# Altium footprint library ACTION_IC封装.PcbLib: 114 footprints (part 2 of 8)
Each footprint in its own frame and in the unit in brackets; x right, y up, seen from the top. Pads: shape width x height; smd on the part's side, far side on the other; paste and mask are expansions set on the pad; w line width, h text height; cw(c..) or ccw(c..) is an arc to the next point about the centre after c.
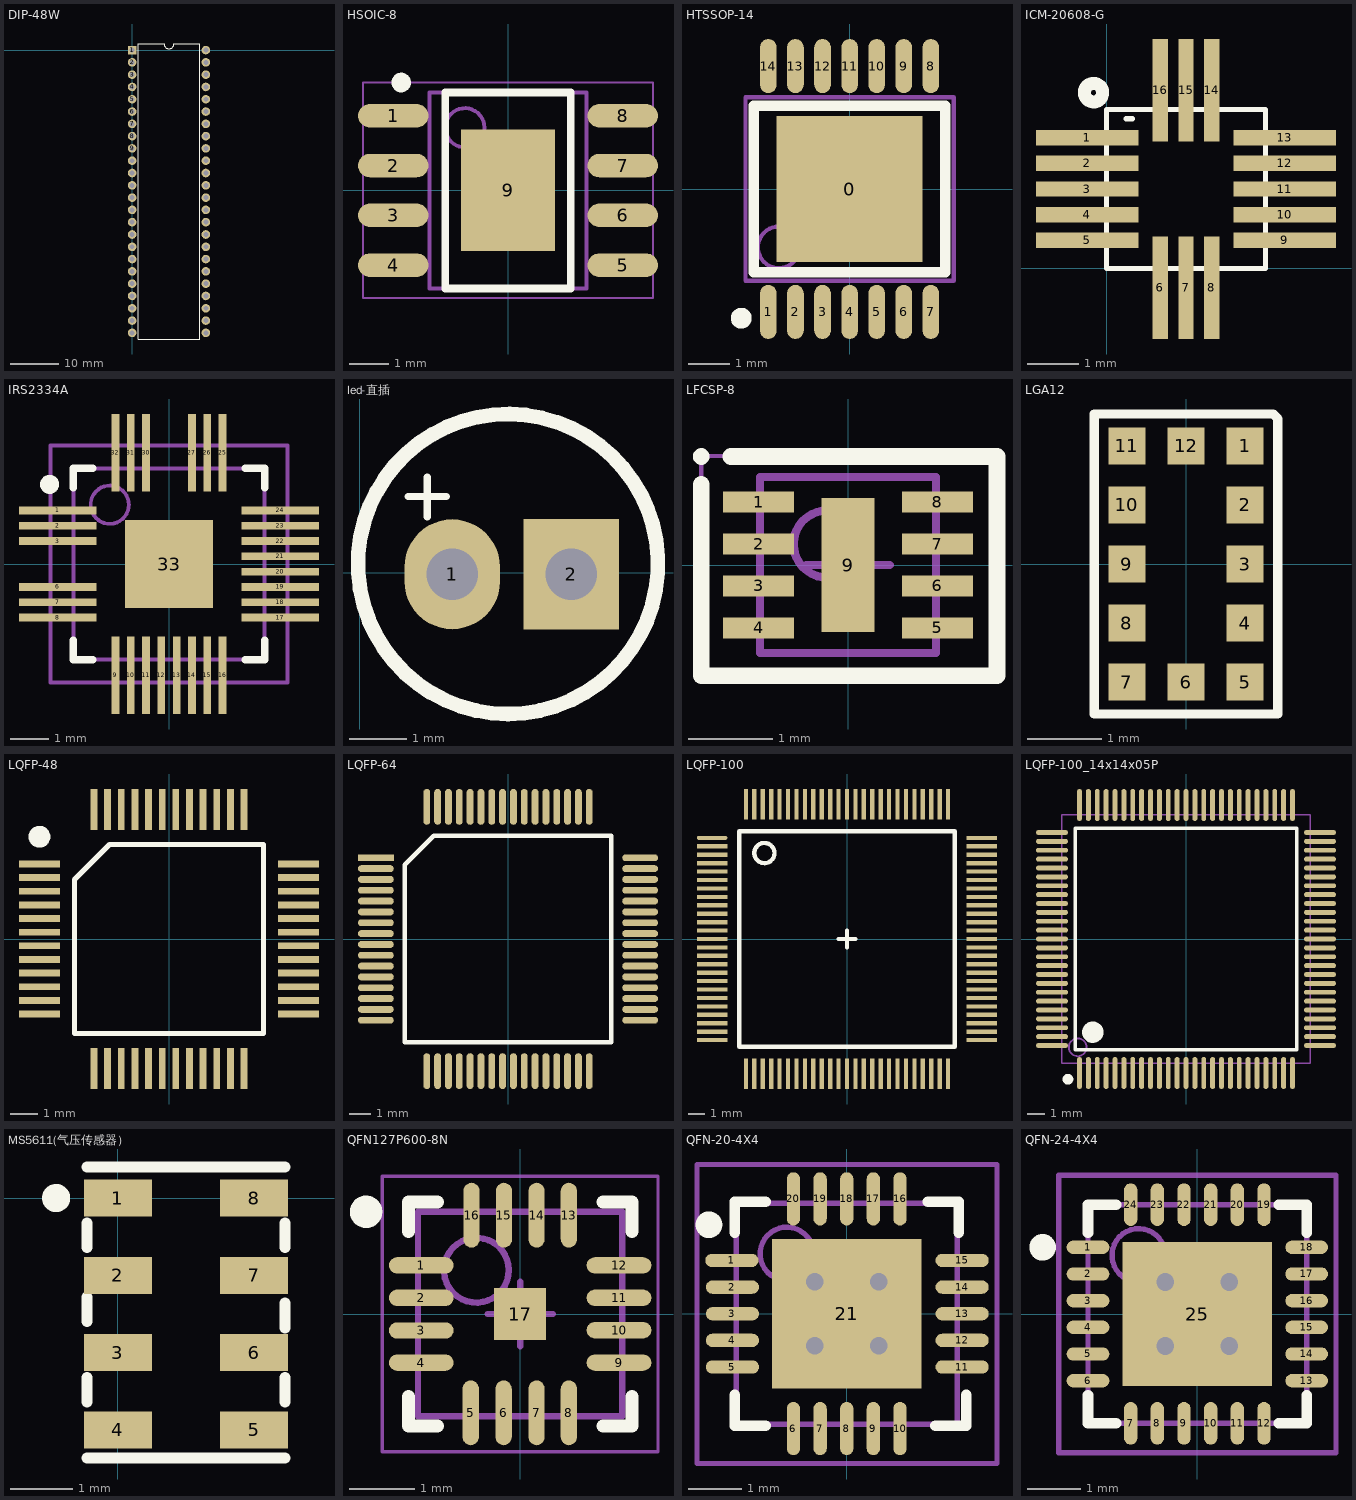
[diagram p1: the footprints below, top view; thin cyan lines are the x and y axes]

## DIP-48W [mil]
pads (48):
  rect 70x70 hole 40: 1(0,0)
  round 70 hole 40: 2(0,-100) 3(0,-200) 4(0,-300) 5(0,-400) 6(0,-500) 7(0,-600) 8(0,-700) 9(0,-800) 10(0,-900) 11(0,-1000) 12(0,-1100) 13(0,-1200) 14(0,-1300) 15(0,-1400) 16(0,-1500) 17(0,-1600) 18(0,-1700) 19(0,-1800) 20(0,-1900) 21(0,-2000) 22(0,-2100) 23(0,-2200) 24(0,-2300) 25(600,-2300) 26(600,-2200) 27(600,-2100) 28(600,-2000) 29(600,-1900) 30(600,-1800) 31(600,-1700) 32(600,-1600) 33(600,-1500) 34(600,-1400) 35(600,-1300) 36(600,-1200) 37(600,-1100) 38(600,-1000) 39(600,-900) 40(600,-800) 41(600,-700) 42(600,-600) 43(600,-500) 44(600,-400) 45(600,-300) 46(600,-200) 47(600,-100) 48(600,0)
Top Overlay:
  lines w10: 50,-2350 550,-2350 550,50 340,50 cw(c300,50) 260,50 50,50 50,-2350
3D body "DIP48.STEP": height 183.46, standoff -129.13, extent 1.52,-2365.87 616.48,55

## HSOIC-8 [mm]
height 1.7
pads (9):
  oval 1.8x0.6 smd: 1(-2.928,1.905) 2(-2.928,0.635) 3(-2.928,-0.635) 4(-2.928,-1.905) 5(2.928,-1.905) 6(2.928,-0.635) 7(2.928,0.635) 8(2.928,1.905)
  rect 2.4x3.1 smd: 9(0,0)
Top Overlay:
  circle w0.25: c-2.725,2.755 r0.125
  lines w0.2: -1.6,-2.5 1.6,-2.5 1.6,2.5 -1.6,2.5 -1.6,-2.5
Mechanical 13:
  circle w0.1: c-1.1,1.6 r0.5
  lines w0.1: -2,-2.5 2,-2.5 2,2.5 -2,2.5 -2,-2.5
Mechanical 15:
  lines w0.05: -3.7,-2.75 3.7,-2.75 3.7,2.75 -3.7,2.75 -3.7,-2.75
  lines w0.1: -0.5,0 0.5,0 ; 0,-0.5 0,0.5
3D body "User Library-sop-8.STEP": height 1.6, standoff 0, extent -3.021,-2.51 3.021,2.51

## HTSSOP-14 [mm]
pads (15):
  rect 3.5x3.5 smd mask+0.051: 0(0,0)
  oval 0.4x1.3 smd mask+0.051: 1(-1.95,-2.95) 2(-1.3,-2.95) 3(-0.65,-2.95) 4(0,-2.95) 5(0.65,-2.95) 6(1.3,-2.95) 7(1.95,-2.95) 8(1.95,2.95) 9(1.3,2.95) 10(0.65,2.95) 11(0,2.95) 12(-0.65,2.95) 13(-1.3,2.95) 14(-1.95,2.95)
Top Overlay:
  circle w0.25: c-2.6,-3.1 r0.125
  lines w0.254: -2.3,-2 -2.3,2 2.3,2 2.3,-2 -2.3,-2
Mechanical 13:
  circle w0.1: c-1.7,-1.4 r0.5
  lines w0.1: -2.5,-2.2 -2.5,2.2 2.5,2.2 2.5,-2.2 -2.5,-2.2

## ICM-20608-G [mm] "ICM-20608-G"
height 0.86
pads (16):
  rect 2x0.3 smd: 1(-0.375,2.55) 2(-0.375,2.05) 3(-0.375,1.55) 4(-0.375,1.05) 5(-0.375,0.55) 9(3.475,0.55) 10(3.475,1.05) 11(3.475,1.55) 12(3.475,2.05) 13(3.475,2.55)
  rect 0.3x2 smd: 6(1.05,-0.375) 7(1.55,-0.375) 8(2.05,-0.375) 14(2.05,3.475) 15(1.55,3.475) 16(1.05,3.475)
Top Overlay:
  lines w0.1: 0.381,2.921 0.508,2.921 ; 0,0 0,3.1 3.1,3.1 3.1,0 0,0
  lines w0.254: -0.254,3.609 ccw(c-0.254,3.429) -0.21,3.603

## IRS2334A [mm] "irs2334"
height 1
pads (29):
  rect 2.032x0.2 smd: 1(-2.906,1.4) 2(-2.906,1) 3(-2.906,0.6) 6(-2.906,-0.6) 7(-2.906,-1) 8(-2.906,-1.4) 17(2.906,-1.4) 18(2.906,-1) 19(2.906,-0.6) 20(2.906,-0.2) 21(2.906,0.2) 22(2.906,0.6) 23(2.906,1) 24(2.906,1.4)
  rect 0.2x2.032 smd: 9(-1.4,-2.906) 10(-1,-2.906) 11(-0.6,-2.906) 12(-0.2,-2.906) 13(0.2,-2.906) 14(0.6,-2.906) 15(1,-2.906) 16(1.4,-2.906) 25(1.4,2.906) 26(1,2.906) 27(0.6,2.906) 30(-0.6,2.906) 31(-1,2.906) 32(-1.4,2.906)
  rect 2.3x2.3 smd: 33(0,0)
Top Overlay:
  circle w0.25: c-3.122,2.083 r0.125
  lines w0.2: -2.5,-2 -2.5,-2.5 -2,-2.5 ; -2.5,2 -2.5,2.5 -2,2.5 ; 2,-2.5 2.5,-2.5 2.5,-2 ; 2,2.5 2.5,2.5 2.5,2
Mechanical 13:
  circle w0.1: c-1.55,1.55 r0.5
  lines w0.1: -2.5,-2.5 2.5,-2.5 2.5,2.5 -2.5,2.5 -2.5,-2.5
Mechanical 15:
  lines w0.1: -0.5,0 0.5,0 ; 0,-0.5 0,0.5 ; -3.1,-3.1 3.1,-3.1 3.1,3.1 -3.1,3.1 -3.1,-3.1
3D body: height 1, standoff 0.02, extent -2.5,-2.5 2.5,2.5

## led-直插 [mil]
pads (2):
  oval 65x75 hole 35.13: 1(63,-1)
  rect 65x75 hole 35.13: 2(144,-1)
Top Overlay:
  lines w5: 33,52 59,52 ; 46,38 46,65
  lines w10: -1.1,2.17 cw(c101,6) -1,0
3D body "LED-R.STEP": height 326.77, standoff -118.11, extent 11.45,-100 192.55,100.79

## LFCSP-8 [mm]
height 0.6
pads (9):
  rect 0.85x0.25 smd: 1(-1.067,0.75) 2(-1.067,0.25) 3(-1.067,-0.25) 4(-1.067,-0.75) 5(1.067,-0.75) 6(1.067,-0.25) 7(1.067,0.25) 8(1.067,0.75)
  rect 0.63x1.6 smd: 9(0,0)
Top Overlay:
  circle w0.1: c-1.753,1.295 r0.05
  lines w0.2: -1.753,0.965 -1.753,-1.321 1.778,-1.321 1.778,1.295 -1.397,1.295
Mechanical 13:
  circle w0.1: c-0.25,0.25 r0.4
  lines w0.1: -1.05,-1.05 -1.05,1.05 1.05,1.05 1.05,-1.05 -1.05,-1.05
Mechanical 15:
  lines w0.05: -1.753,-1.3 -1.753,1.3 1.778,1.3 1.778,-1.3 -1.753,-1.3
  lines w0.1: -0.5,0 0.5,0 ; 0,-0.5 0,0.5
3D body: height 0.6, standoff 0.05, extent -1.05,-1.05 1.05,1.05

## LGA12 [mm]
pads (12):
  rect 0.5x0.5 smd: 1(0.8,1.6) 2(0.8,0.8) 3(0.8,0) 4(0.8,-0.8) 5(0.8,-1.6) 6(0,-1.6) 7(-0.8,-1.6) 8(-0.8,-0.8) 9(-0.8,0) 10(-0.8,0.8) 11(-0.8,1.6) 12(0,1.6)
Top Overlay:
  lines w0.127: -1.245,-2.032 -1.245,2.032 1.181,2.032 1.245,1.968 1.245,-2.032 -1.245,-2.032
3D body: height 1.05, standoff 0, extent -1.168,-1.956 1.143,1.956

## LQFP-48 [mm]
pads (48):
  rect 1.5x0.25 smd: 1(-4.75,2.75) 2(-4.75,2.25) 3(-4.75,1.75) 4(-4.75,1.25) 5(-4.75,0.75) 6(-4.75,0.25) 7(-4.75,-0.25) 8(-4.75,-0.75) 9(-4.75,-1.25) 10(-4.75,-1.75) 11(-4.75,-2.25) 12(-4.75,-2.75) 25(4.75,-2.75) 26(4.75,-2.25) 27(4.75,-1.75) 28(4.75,-1.25) 29(4.75,-0.75) 30(4.75,-0.25) 31(4.75,0.25) 32(4.75,0.75) 33(4.75,1.25) 34(4.75,1.75) 35(4.75,2.25) 36(4.75,2.75)
  rect 0.25x1.5 smd: 13(-2.75,-4.75) 14(-2.25,-4.75) 15(-1.75,-4.75) 16(-1.25,-4.75) 17(-0.75,-4.75) 18(-0.25,-4.75) 19(0.25,-4.75) 20(0.75,-4.75) 21(1.25,-4.75) 22(1.75,-4.75) 23(2.25,-4.75) 24(2.75,-4.75) 37(2.75,4.75) 38(2.25,4.75) 39(1.75,4.75) 40(1.25,4.75) 41(0.75,4.75) 42(0.25,4.75) 43(-0.25,4.75) 44(-0.75,4.75) 45(-1.25,4.75) 46(-1.75,4.75) 47(-2.25,4.75) 48(-2.75,4.75)
Top Overlay:
  circle w0.4: c-4.75,3.75 r0.2
  lines w0.2: -3.465,-3.465 3.465,-3.465 3.465,3.465 -2.18,3.465 -3.465,2.18 -3.465,-3.465
3D body "LQFP7X7-48.STEP": height 1.56, standoff 0, extent -4.525,-4.48 4.474,4.52

## LQFP-64 [mm]
pads (64):
  rect 1.651x0.32 smd: 1(-6.1,3.75)
  oval 1.651x0.32 smd: 2(-6.1,3.25) 3(-6.1,2.75) 4(-6.1,2.25) 5(-6.1,1.75) 6(-6.1,1.25) 7(-6.1,0.75) 8(-6.1,0.25) 9(-6.1,-0.25) 10(-6.1,-0.75) 11(-6.1,-1.25) 12(-6.1,-1.75) 13(-6.1,-2.25) 14(-6.1,-2.75) 15(-6.1,-3.25) 16(-6.1,-3.75) 33(6.1,-3.75) 34(6.1,-3.25) 35(6.1,-2.75) 36(6.1,-2.25) 37(6.1,-1.75) 38(6.1,-1.25) 39(6.1,-0.75) 40(6.1,-0.25) 41(6.1,0.25) 42(6.1,0.75) 43(6.1,1.25) 44(6.1,1.75) 45(6.1,2.25) 46(6.1,2.75) 47(6.1,3.25) 48(6.1,3.75)
  oval 0.32x1.651 smd: 17(-3.75,-6.1) 18(-3.25,-6.1) 19(-2.75,-6.1) 20(-2.25,-6.1) 21(-1.75,-6.1) 22(-1.25,-6.1) 23(-0.75,-6.1) 24(-0.25,-6.1) 25(0.25,-6.1) 26(0.75,-6.1) 27(1.25,-6.1) 28(1.75,-6.1) 29(2.25,-6.1) 30(2.75,-6.1) 31(3.25,-6.1) 32(3.75,-6.1) 49(3.75,6.1) 50(3.25,6.1) 51(2.75,6.1) 52(2.25,6.1) 53(1.75,6.1) 54(1.25,6.1) 55(0.75,6.1) 56(0.25,6.1) 57(-0.25,6.1) 58(-0.75,6.1) 59(-1.25,6.1) 60(-1.75,6.1) 61(-2.25,6.1) 62(-2.75,6.1) 63(-3.25,6.1) 64(-3.75,6.1)
Top Overlay:
  lines w0.2: -4.765,-4.765 4.765,-4.765 4.765,4.765 -3.43,4.765 -4.765,3.43 -4.765,-4.765
3D body "LQFP-64.STEP": height 1.6, standoff 0, extent -5.949,-6 6.051,6

## LQFP-100 [mm]
pads (100):
  oval 1.8x0.25 smd: 1(-8,6)
  rect 1.8x0.25 smd: 2(-8,5.5) 3(-8,5) 4(-8,4.5) 5(-8,4) 6(-8,3.5) 7(-8,3) 8(-8,2.5) 9(-8,2) 10(-8,1.5) 11(-8,1) 12(-8,0.5) 13(-8,0) 14(-8,-0.5) 15(-8,-1) 16(-8,-1.5) 17(-8,-2) 18(-8,-2.5) 19(-8,-3) 20(-8,-3.5) 21(-8,-4) 22(-8,-4.5) 23(-8,-5) 24(-8,-5.5) 25(-8,-6) 51(8,-6) 52(8,-5.5) 53(8,-5) 54(8,-4.5) 55(8,-4) 56(8,-3.5) 57(8,-3) 58(8,-2.5) 59(8,-2) 60(8,-1.5) 61(8,-1) 62(8,-0.5) 63(8,0) 64(8,0.5) 65(8,1) 66(8,1.5) 67(8,2) 68(8,2.5) 69(8,3) 70(8,3.5) 71(8,4) 72(8,4.5) 73(8,5) 74(8,5.5) 75(8,6)
  rect 0.25x1.8 smd: 26(-6,-8) 27(-5.5,-8) 28(-5,-8) 29(-4.5,-8) 30(-4,-8) 31(-3.5,-8) 32(-3,-8) 33(-2.5,-8) 34(-2,-8) 35(-1.5,-8) 36(-1,-8) 37(-0.5,-8) 38(0,-8) 39(0.5,-8) 40(1,-8) 41(1.5,-8) 42(2,-8) 43(2.5,-8) 44(3,-8) 45(3.5,-8) 46(4,-8) 47(4.5,-8) 48(5,-8) 49(5.5,-8) 50(6,-8) 76(6,8) 77(5.5,8) 78(5,8) 79(4.5,8) 80(4,8) 81(3.5,8) 82(3,8) 83(2.5,8) 84(2,8) 85(1.5,8) 86(1,8) 87(0.5,8) 88(0,8) 89(-0.5,8) 90(-1,8) 91(-1.5,8) 92(-2,8) 93(-2.5,8) 94(-3,8) 95(-3.5,8) 96(-4,8) 97(-4.5,8) 98(-5,8) 99(-5.5,8) 100(-6,8)
Top Overlay:
  circle w0.254: c-4.9,5.1 r0.6
  lines w0.254: -0.5,0 0.5,0 ; 0,-0.5 0,0.5 ; -6.4,-6.4 6.4,-6.4 6.4,6.4 -6.4,6.4 -6.4,-6.4
3D body "LQFP-100.STEP": height 1.6, standoff 0, extent -7.97,-7.969 8.03,8.031

## LQFP-100_14x14x05P [mm]
pads (100):
  oval 0.28x1.8 smd mask+0.051: 1(-6,-7.55) 2(-5.5,-7.55) 3(-5,-7.55) 4(-4.5,-7.55) 5(-4,-7.55) 6(-3.5,-7.55) 7(-3,-7.55) 8(-2.5,-7.55) 9(-2,-7.55) 10(-1.5,-7.55) 11(-1,-7.55) 12(-0.5,-7.55) 13(0,-7.55) 14(0.5,-7.55) 15(1,-7.55) 16(1.5,-7.55) 17(2,-7.55) 18(2.5,-7.55) 19(3,-7.55) 20(3.5,-7.55) 21(4,-7.55) 22(4.5,-7.55) 23(5,-7.55) 24(5.5,-7.55) 25(6,-7.55) 51(6,7.55) 52(5.5,7.55) 53(5,7.55) 54(4.5,7.55) 55(4,7.55) 56(3.5,7.55) 57(3,7.55) 58(2.5,7.55) 59(2,7.55) 60(1.5,7.55) 61(1,7.55) 62(0.5,7.55) 63(0,7.55) 64(-0.5,7.55) 65(-1,7.55) 66(-1.5,7.55) 67(-2,7.55) 68(-2.5,7.55) 69(-3,7.55) 70(-3.5,7.55) 71(-4,7.55) 72(-4.5,7.55) 73(-5,7.55) 74(-5.5,7.55) 75(-6,7.55)
  oval 1.8x0.28 smd mask+0.051: 26(7.55,-6) 27(7.55,-5.5) 28(7.55,-5) 29(7.55,-4.5) 30(7.55,-4) 31(7.55,-3.5) 32(7.55,-3) 33(7.55,-2.5) 34(7.55,-2) 35(7.55,-1.5) 36(7.55,-1) 37(7.55,-0.5) 38(7.55,0) 39(7.55,0.5) 40(7.55,1) 41(7.55,1.5) 42(7.55,2) 43(7.55,2.5) 44(7.55,3) 45(7.55,3.5) 46(7.55,4) 47(7.55,4.5) 48(7.55,5) 49(7.55,5.5) 50(7.55,6) 76(-7.55,6) 77(-7.55,5.5) 78(-7.55,5) 79(-7.55,4.5) 80(-7.55,4) 81(-7.55,3.5) 82(-7.55,3) 83(-7.55,2.5) 84(-7.55,2) 85(-7.55,1.5) 86(-7.55,1) 87(-7.55,0.5) 88(-7.55,0) 89(-7.55,-0.5) 90(-7.55,-1) 91(-7.55,-1.5) 92(-7.55,-2) 93(-7.55,-2.5) 94(-7.55,-3) 95(-7.55,-3.5) 96(-7.55,-4) 97(-7.55,-4.5) 98(-7.55,-5) 99(-7.55,-5.5) 100(-7.55,-6)
Top Overlay:
  circle w0.6: c-5.25,-5.25 r0.3
  circle w0.3: c-6.65,-7.9 r0.15
  lines w0.2: -6.25,-6.25 -6.25,6.25 6.25,6.25 6.25,-6.25 -6.25,-6.25
Mechanical 13:
  circle w0.1: c-6.1,-6.1 r0.5
  lines w0.1: -7,-7 -7,7 7,7 7,-7 -7,-7
3D body "User Library-LQFP100_Grid_0_5.STEP": height 1.6, standoff 0, extent -8,-8 8,8

## MS5611(气压传感器） [mm]
pads (8):
  rect 1.1x0.6 smd: 1(0,0) 2(0,-1.25) 3(0,-2.5) 4(0,-3.75) 5(2.2,-3.75) 6(2.2,-2.5) 7(2.2,-1.25) 8(2.2,0)
Top Overlay:
  circle w0.254: c-1,0 r0.1
  lines w0.178: -0.5,-4.2 2.7,-4.2 ; -0.5,-3.3 -0.5,-2.9 ; -0.5,-2 -0.5,-1.6 ; -0.5,-0.8 -0.5,-0.4 ; -0.5,0.5 2.7,0.5 ; 2.7,-3.3 2.7,-2.9 ; 2.7,-2.1 2.7,-1.7 ; 2.7,-0.8 2.7,-0.4

## QFN127P600-8N [mm]
height 0.8
pads (17):
  oval 1x0.25 smd: 1(-1.524,0.75) 2(-1.524,0.25) 3(-1.524,-0.254) 4(-1.524,-0.75) 9(1.524,-0.75) 10(1.524,-0.25) 11(1.524,0.25) 12(1.524,0.75)
  oval 0.25x1 smd: 5(-0.762,-1.524) 6(-0.254,-1.524) 7(0.254,-1.524) 8(0.75,-1.524) 13(0.75,1.524) 14(0.254,1.524) 15(-0.25,1.524) 16(-0.75,1.524)
  rect 0.8x0.8 smd: 17(0,0)
Top Overlay:
  circle w0.25: c-2.375,1.575 r0.125
  lines w0.2: -1.725,-1.275 -1.725,-1.725 -1.275,-1.725 ; -1.725,1.275 -1.725,1.725 -1.275,1.725 ; 1.275,-1.725 1.725,-1.725 1.725,-1.275 ; 1.275,1.725 1.725,1.725 1.725,1.275
Mechanical 13:
  circle w0.1: c-0.675,0.675 r0.5
  lines w0.1: -1.575,-1.575 1.575,-1.575 1.575,1.575 -1.575,1.575 -1.575,-1.575
Mechanical 15:
  lines w0.05: -2.125,-2.125 2.125,-2.125 2.125,2.125 -2.125,2.125 -2.125,-2.125
  lines w0.1: -0.5,0 0.5,0 ; 0,-0.5 0,0.5
3D body: height 0.8, standoff 0.05, extent -1.575,-1.575 1.575,1.575

## QFN-20-4X4 [mm]
pads (21):
  oval 1x0.25 smd: 1(-2.155,1) 2(-2.145,0.5) 3(-2.145,0) 4(-2.145,-0.5) 5(-2.145,-1) 11(2.165,-1) 12(2.165,-0.5) 13(2.165,0) 14(2.165,0.5) 15(2.165,1)
  oval 0.25x1 smd: 6(-1,-2.155) 7(-0.5,-2.155) 8(0,-2.155) 9(0.5,-2.155) 10(1,-2.155) 16(1,2.155) 17(0.5,2.155) 18(0,2.155) 19(-0.5,2.155) 20(-1,2.155)
  rect 2.8x2.8 smd: 21(0,0)
via 0.6,-0.6 diameter 0.66 hole 0.33
via -0.6,-0.6 diameter 0.66 hole 0.33
via 0.6,0.6 diameter 0.66 hole 0.33
via -0.6,0.6 diameter 0.66 hole 0.33
Top Overlay:
  circle w0.25: c-2.585,1.67 r0.125
  lines w0.2: -2.1,-1.525 -2.1,-2.1 -1.525,-2.1 ; -2.1,1.525 -2.1,2.1 -1.525,2.1 ; 1.525,2.1 2.1,2.1 2.1,1.525 ; 1.665,-2.1 2.24,-2.1 2.24,-1.525
Mechanical 13:
  circle w0.1: c-1.125,1.125 r0.5
  lines w0.1: -2.075,-2.075 2.075,-2.075 2.075,2.075 -2.075,2.075 -2.075,-2.075
Mechanical 15:
  lines w0.1: -0.5,0 0.5,0 ; 0,-0.5 0,0.5 ; -2.81,-2.81 2.82,-2.81 2.82,2.8 -2.81,2.8 -2.81,-2.81
3D body "User Library-QFN20(4x4).STEP": height 0.9, standoff -0.02, extent -2,-2 2,2

## QFN-24-4X4 [mm]
pads (25):
  oval 0.8x0.25 smd: 1(-2.05,1.25) 2(-2.05,0.75) 3(-2.05,0.25) 4(-2.05,-0.25) 5(-2.05,-0.75) 6(-2.05,-1.25) 13(2.05,-1.25) 14(2.05,-0.75) 15(2.05,-0.25) 16(2.05,0.25) 17(2.05,0.75) 18(2.05,1.25)
  oval 0.25x0.8 smd: 7(-1.25,-2.05) 8(-0.75,-2.05) 9(-0.25,-2.05) 10(0.25,-2.05) 11(0.75,-2.05) 12(1.25,-2.05) 19(1.25,2.05) 20(0.75,2.05) 21(0.25,2.05) 22(-0.25,2.05) 23(-0.75,2.05) 24(-1.25,2.05)
  rect 2.8x2.7 smd: 25(0,0)
via -0.6,0.6 diameter 0.66 hole 0.33
via 0.6,0.6 diameter 0.66 hole 0.33
via -0.6,-0.6 diameter 0.66 hole 0.33
via 0.6,-0.6 diameter 0.66 hole 0.33
Top Overlay:
  circle w0.25: c-2.9,1.25 r0.125
  lines w0.2: -2.05,-1.525 -2.05,-2.05 -1.525,-2.05 ; -2.05,1.525 -2.05,2.05 -1.525,2.05 ; 1.525,-2.05 2.05,-2.05 2.05,-1.525 ; 1.525,2.05 2.05,2.05 2.05,1.525
Mechanical 13:
  circle w0.1: c-1.1,1.1 r0.5
  lines w0.1: -2.05,-2.05 -2.05,2.05 2.05,2.05 2.05,-2.05 -2.05,-2.05
Mechanical 15:
  lines w0.1: -0.5,0 0.5,0 ; 0,-0.5 0,0.5 ; -2.6,-2.6 -2.6,2.6 2.6,2.6 2.6,-2.6 -2.6,-2.6
3D body "MLF24.STEP": height 1, standoff 0, extent -2,-1.981 2,2.019